# Altium footprint library Nanjar's Arduino Library.PcbLib: 16 footprints
Each footprint in its own frame and in the unit in brackets; x right, y up, seen from the top. Pads: shape width x height; smd on the part's side, far side on the other; paste and mask are expansions set on the pad; w line width, h text height; cw(c..) or ccw(c..) is an arc to the next point about the centre after c.
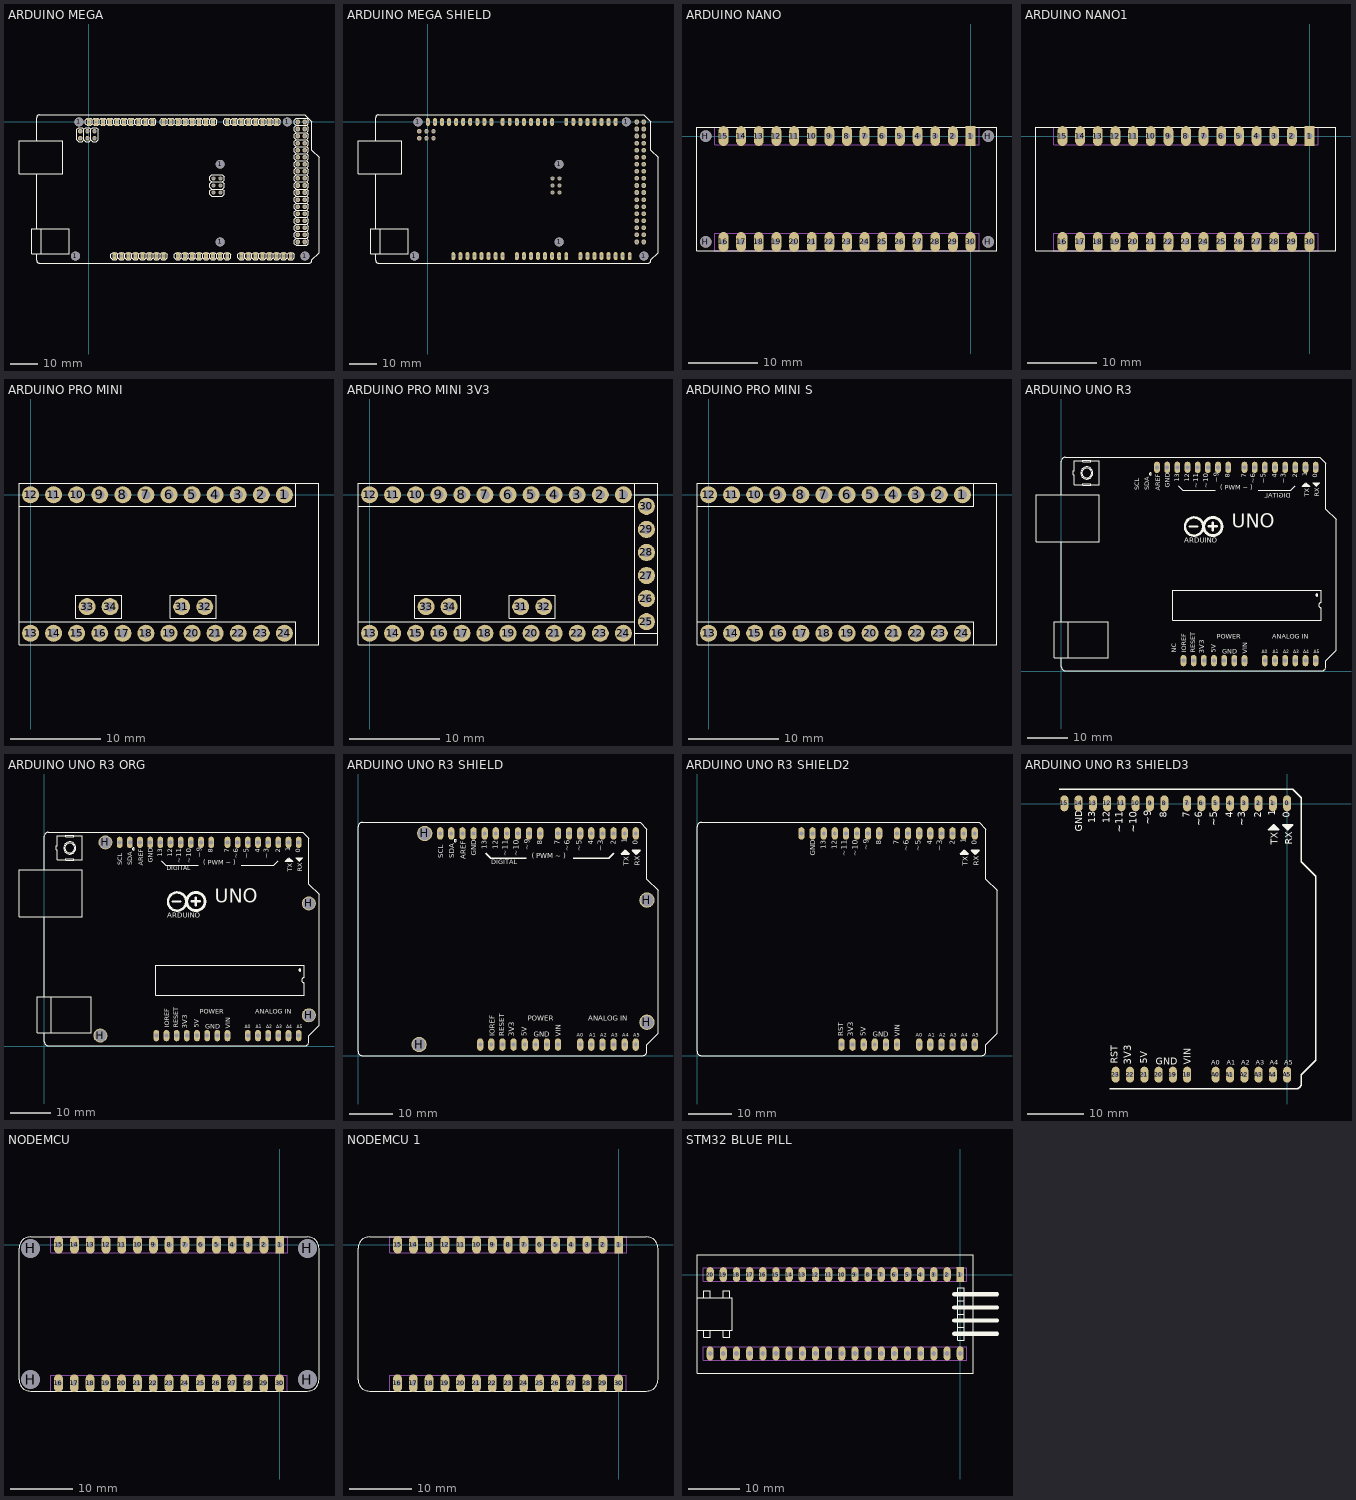
[diagram p0: the footprints below, top view; thin cyan lines are the x and y axes]

## ARDUINO MEGA [mil]
pads (104):
  round 125.98 hole 125.98: 1(-190,-1900) 1(-140,0) 1(1860,-1700) 1(1860,-600) 1(2810,0) 1(3060,-1900)
  oval 56x112 hole 33.46: 1(0,0) 1(360,-1900) 1(1260,-1900) 1(1760,0) 1(2160,-1900) 1(2660,0) 2(100,0) 2(460,-1900) 2(1360,-1900) 2(1660,0) 2(2260,-1900) 2(2560,0) 3(200,0) 3(560,-1900) 3(1460,-1900) 3(1560,0) 3(2360,-1900) 3(2460,0) 4(300,0) 4(660,-1900) 4(1460,0) 4(1560,-1900) 4(2360,0) 4(2460,-1900) 5(400,0) 5(760,-1900) 5(1360,0) 5(1660,-1900) 5(2260,0) 5(2560,-1900) 6(500,0) 6(860,-1900) 6(1260,0) 6(1760,-1900) 6(2160,0) 6(2660,-1900) 7(600,0) 7(960,-1900) 7(1160,0) 7(1860,-1900) 7(2060,0) 7(2760,-1900) 8(700,0) 8(1060,-1900) 8(1060,0) 8(1960,-1900) 8(1960,0) 8(2860,-1900) 9(800,0) 10(900,0)
  oct 61.02x61.02 hole 37.4: 1(80,-130) 1(1765,-800) 2(80,-230) 2(1865,-800) 3(-20,-130) 3(1765,-900) 4(-20,-230) 4(1865,-900) 5(-120,-130) 5(1765,-1000) 6(-120,-230) 6(1865,-1000)
  oct 66x66 hole 37.4: 1(2960,0) 2(3060,0) 3(2960,-100) 4(3060,-100) 5(2960,-200) 6(3060,-200) 7(2960,-300) 8(3060,-300) 9(2960,-400) 10(3060,-400) 11(2960,-500) 12(3060,-500) 13(2960,-600) 14(3060,-600) 15(2960,-700) 16(3060,-700) 17(2960,-800) 18(3060,-800) 19(2960,-900) 20(3060,-900) 21(2960,-1000) 22(3060,-1000) 23(2960,-1100) 24(3060,-1100) 25(2960,-1200) 26(3060,-1200) 27(2960,-1300) 28(3060,-1300) 29(2960,-1400) 30(3060,-1400) 31(2960,-1500) 32(3060,-1500) 33(2960,-1600) 34(3060,-1600) 35(2960,-1700) 36(3060,-1700)
Top Overlay:
  drawing of 553 lines, arcs and shapes, not listed

## ARDUINO MEGA 3D on Bottom [mil]
3D body "User Library-ARDUINO_MEGA_2560.STEP": height -76.77, standoff -677.17, extent -4250,0 0,2100

## ARDUINO MEGA SHIELD [mil]
pads (104):
  round 125.98 hole 125.98: 1(-190,-1900) 1(-140,0) 1(1860,-1700) 1(1860,-600) 1(2810,0) 1(3060,-1900)
  oval 56x112 hole 33.46: 1(0,0) 1(360,-1900) 1(1260,-1900) 1(1760,0) 1(2160,-1900) 1(2660,0) 2(100,0) 2(460,-1900) 2(1360,-1900) 2(1660,0) 2(2260,-1900) 2(2560,0) 3(200,0) 3(560,-1900) 3(1460,-1900) 3(1560,0) 3(2360,-1900) 3(2460,0) 4(300,0) 4(660,-1900) 4(1460,0) 4(1560,-1900) 4(2360,0) 4(2460,-1900) 5(400,0) 5(760,-1900) 5(1360,0) 5(1660,-1900) 5(2260,0) 5(2560,-1900) 6(500,0) 6(860,-1900) 6(1260,0) 6(1760,-1900) 6(2160,0) 6(2660,-1900) 7(600,0) 7(960,-1900) 7(1160,0) 7(1860,-1900) 7(2060,0) 7(2760,-1900) 8(700,0) 8(1060,-1900) 8(1060,0) 8(1960,-1900) 8(1960,0) 8(2860,-1900) 9(800,0) 10(900,0)
  oct 61.02x61.02 hole 37.4: 1(80,-130) 1(1765,-800) 2(80,-230) 2(1865,-800) 3(-20,-130) 3(1765,-900) 4(-20,-230) 4(1865,-900) 5(-120,-130) 5(1765,-1000) 6(-120,-230) 6(1865,-1000)
  oct 66x66 hole 37.4: 1(2960,0) 2(3060,0) 3(2960,-100) 4(3060,-100) 5(2960,-200) 6(3060,-200) 7(2960,-300) 8(3060,-300) 9(2960,-400) 10(3060,-400) 11(2960,-500) 12(3060,-500) 13(2960,-600) 14(3060,-600) 15(2960,-700) 16(3060,-700) 17(2960,-800) 18(3060,-800) 19(2960,-900) 20(3060,-900) 21(2960,-1000) 22(3060,-1000) 23(2960,-1100) 24(3060,-1100) 25(2960,-1200) 26(3060,-1200) 27(2960,-1300) 28(3060,-1300) 29(2960,-1400) 30(3060,-1400) 31(2960,-1500) 32(3060,-1500) 33(2960,-1600) 34(3060,-1600) 35(2960,-1700) 36(3060,-1700)
Top Overlay:
  lines w5: -674,-1869 -674,-1516 ; -674,-1516 -811,-1516 -811,-1870 -292.5,-1870 -280,-1870 -280,-1570 -280,-1516 -674,-1516
  lines w10: -740,-1873 -740,-1960.63 ccw(c-700.63,-1960.63) -700.63,-2000 3120.63,-2000 ccw(c3120.63,-1960.63) 3160,-1960.63 3160,-1950 3260,-1850 3260,-500 3160,-400 3160,0 3060,100 -700.63,100 ccw(c-700.63,60.63) -740,60.63 -740,-267.72 ; -740,-1513 -740,-732.28 ; -989.61,-732.28 -369.53,-732.28 -369.53,-267.72 -989.61,-267.72 -989.61,-732.28

## ARDUINO NANO [mil]
pads (34):
  rect 56x112 hole 36: 1(0,0)
  oval 56x112 hole 36: 2(-100,0) 3(-200,0) 4(-300,0) 5(-400,0) 6(-500,0) 7(-600,0) 8(-700,0) 9(-800,0) 10(-900,0) 11(-1000,0) 12(-1100,0) 13(-1200,0) 14(-1300,0) 15(-1400,0) 16(-1400,-600) 17(-1300,-600) 18(-1200,-600) 19(-1100,-600) 20(-1000,-600) 21(-900,-600) 22(-800,-600) 23(-700,-600) 24(-600,-600) 25(-500,-600) 26(-400,-600) 27(-300,-600) 28(-200,-600) 29(-100,-600) 30(0,-600)
  round 65 hole 65: H(-1500,-600) H(-1500,0) H(100,-600) H(100,0)
Top Overlay:
  lines w7: -1550,-650 150,-650 150,50 -1550,50 -1550,-650
Mechanical 8:
  lines w5: -1450,-650 -1450,-550 50,-550 50,-650 -1450,-650 ; -1450,-50 -1450,50 50,50 50,-50 -1450,-50
3D body "arduino_nano.stp": height 651.57, standoff 106.3, extent -1621.26,-654.33 150.39,54.33
3D body "Header Female 2p.step": height 334.65, standoff -82.42, extent -950,-650 -750,-550
3D body "Header Female 2p.step": height 334.65, standoff -82.42, extent -1150,-650 -950,-550
3D body "Header Female 2p.step": height 334.65, standoff -82.42, extent -150,-650 50,-550
3D body "Header Female 2p.step": height 334.65, standoff -82.42, extent -350,-650 -150,-550
3D body "Header Female 2p.step": height 334.65, standoff -82.42, extent -550,-650 -350,-550
3D body "Header Female 2p.step": height 334.65, standoff -82.42, extent -750,-650 -550,-550
3D body "Header Female 2p.step": height 334.65, standoff -82.42, extent -950,-50 -750,50
3D body "Header Female 2p.step": height 334.65, standoff -82.42, extent -1150,-50 -950,50
3D body "Header Female 2p.step": height 334.65, standoff -82.42, extent -150,-50 50,50
3D body "Header Female 2p.step": height 334.65, standoff -82.42, extent -350,-50 -150,50
3D body "Header Female 2p.step": height 334.65, standoff -82.42, extent -550,-50 -350,50
3D body "Header Female 2p.step": height 334.65, standoff -82.42, extent -750,-50 -550,50
3D body "Header Female 2p.step": height 334.65, standoff -82.42, extent -1350,-50 -1150,50
3D body "Header Female 1p.step": height 334.65, standoff -82.42, extent -1450,-50 -1350,50
3D body "Header Female 2p.step": height 334.65, standoff -82.42, extent -1350,-650 -1150,-550
3D body "Header Female 1p.step": height 334.65, standoff -82.42, extent -1450,-650 -1350,-550

## ARDUINO NANO1 [mil]
pads (30):
  rect 56x112 hole 36: 1(0,0)
  oval 56x112 hole 36: 2(-100,0) 3(-200,0) 4(-300,0) 5(-400,0) 6(-500,0) 7(-600,0) 8(-700,0) 9(-800,0) 10(-900,0) 11(-1000,0) 12(-1100,0) 13(-1200,0) 14(-1300,0) 15(-1400,0) 16(-1400,-600) 17(-1300,-600) 18(-1200,-600) 19(-1100,-600) 20(-1000,-600) 21(-900,-600) 22(-800,-600) 23(-700,-600) 24(-600,-600) 25(-500,-600) 26(-400,-600) 27(-300,-600) 28(-200,-600) 29(-100,-600) 30(0,-600)
Top Overlay:
  lines w7: -1550,-650 -1550,50 150,50 150,-650 -1550,-650
Mechanical 8:
  lines w5: -1450,-650 50,-650 50,-550 -1450,-550 -1450,-650 ; -1450,-50 50,-50 50,50 -1450,50 -1450,-50
3D body "Header Female 1p.step": height 334.65, standoff -82.42, extent -1450,-650 -1350,-550
3D body "Header Female 2p.step": height 334.65, standoff -82.42, extent -1350,-650 -1150,-550
3D body "Header Female 1p.step": height 334.65, standoff -82.42, extent -1450,-50 -1350,50
3D body "Header Female 2p.step": height 334.65, standoff -82.42, extent -1350,-50 -1150,50
3D body "Header Female 2p.step": height 334.65, standoff -82.42, extent -750,-50 -550,50
3D body "Header Female 2p.step": height 334.65, standoff -82.42, extent -550,-50 -350,50
3D body "Header Female 2p.step": height 334.65, standoff -82.42, extent -350,-50 -150,50
3D body "Header Female 2p.step": height 334.65, standoff -82.42, extent -150,-50 50,50
3D body "Header Female 2p.step": height 334.65, standoff -82.42, extent -1150,-50 -950,50
3D body "Header Female 2p.step": height 334.65, standoff -82.42, extent -950,-50 -750,50
3D body "Header Female 2p.step": height 334.65, standoff -82.42, extent -750,-650 -550,-550
3D body "Header Female 2p.step": height 334.65, standoff -82.42, extent -550,-650 -350,-550
3D body "Header Female 2p.step": height 334.65, standoff -82.42, extent -350,-650 -150,-550
3D body "Header Female 2p.step": height 334.65, standoff -82.42, extent -150,-650 50,-550
3D body "Header Female 2p.step": height 334.65, standoff -82.42, extent -1150,-650 -950,-550
3D body "Header Female 2p.step": height 334.65, standoff -82.42, extent -950,-650 -750,-550
3D body "arduino_nano.stp": height 651.57, standoff 106.3, extent -1621.26,-654.33 150.39,54.33

## ARDUINO PRO MINI [mil]
pads (28):
  round 74 hole 40: 1(1100,0) 2(1000,0) 3(900,0) 4(800,0) 5(700,0) 6(600,0) 7(500,0) 8(400,0) 9(300,0) 10(200,0) 11(100,0) 12(0,0) 13(0,-600) 14(100,-600) 15(200,-600) 16(300,-600) 17(400,-600) 18(500,-600) 19(600,-600) 20(700,-600) 21(800,-600) 22(900,-600) 23(1000,-600) 24(1100,-600) 31(655,-485) 32(755,-485) 33(245,-485) 34(345,-485)
Top Overlay:
  lines w5: -50,-649.61 -50,50 ; 550,50 1250,50 1250,-650 -50,-650 ; -50,-650 -50,-550 1150,-550 1150,-650 -50,-650 ; -50,50 1150,50 1150,-50 -50,-50 -50,50 ; 195,-535 195,-435 395,-435 395,-535 195,-535 ; 605,-535 805,-535 805,-435 605,-435 605,-535
3D body "Header Female 2p.step": height 334.65, standoff -82.42, extent 195,-535 395,-435
3D body "Header Female 2p.step": height 334.65, standoff -82.42, extent 605,-535 805,-435
3D body "Header Female 2p.step": height 334.65, standoff -82.42, extent -50,-50 150,50
3D body "Header Female 2p.step": height 334.65, standoff -82.42, extent -50,-650 150,-550
3D body "Header Female 2p.step": height 334.65, standoff -82.42, extent 150,-650 350,-550
3D body "Header Female 2p.step": height 334.65, standoff -82.42, extent 350,-650 550,-550
3D body "Header Female 2p.step": height 334.65, standoff -82.42, extent 550,-650 750,-550
3D body "Header Female 2p.step": height 334.65, standoff -82.42, extent 750,-650 950,-550
3D body "Header Female 2p.step": height 334.65, standoff -82.42, extent 950,-650 1150,-550
3D body "Header Female 2p.step": height 334.65, standoff -82.42, extent 150,-50 350,50
3D body "Header Female 2p.step": height 334.65, standoff -82.42, extent 350,-50 550,50
3D body "Header Female 2p.step": height 334.65, standoff -82.42, extent 550,-50 750,50
3D body "Header Female 2p.step": height 334.65, standoff -82.42, extent 750,-50 950,50
3D body "Header Female 2p.step": height 334.65, standoff -82.42, extent 950,-50 1150,50
3D body "Pro Mini.stp": height 571.07, standoff 69.29, extent -50,-650 1250,50

## ARDUINO PRO MINI 3V3 [mil]
pads (34):
  round 74 hole 40: 1(1100,0) 2(1000,0) 3(900,0) 4(800,0) 5(700,0) 6(600,0) 7(500,0) 8(400,0) 9(300,0) 10(200,0) 11(100,0) 12(0,0) 13(0,-600) 14(100,-600) 15(200,-600) 16(300,-600) 17(400,-600) 18(500,-600) 19(600,-600) 20(700,-600) 21(800,-600) 22(900,-600) 23(1000,-600) 24(1100,-600) 25(1200,-550) 26(1200,-450) 27(1200,-350) 28(1200,-250) 29(1200,-150) 30(1200,-50) 31(655,-485) 32(755,-485) 33(245,-485) 34(345,-485)
Top Overlay:
  lines w5: -50,-649.61 -50,50 ; 550,50 1250,50 1250,-650 -50,-650 ; 1150,0 1250,0 ; 1250,-600 1150,-600 1150,-330.12 ; -50,-650 -50,-550 1150,-550 1150,-650 -50,-650 ; -50,50 1150,50 1150,-50 ; -50,50 -50,-50 1150,-50 ; 1150,-330.12 1150,-330.12 ; 1150,-330.12 1150,-50 ; 195,-535 195,-435 395,-435 395,-535 195,-535 ; 605,-535 805,-535 805,-435 605,-435 605,-535
3D body "ASSEMBLY_AP214.STEP": height 571.07, standoff 69.29, extent -50,-650 1250,50
3D body "Header Female 2p.step": height 334.65, standoff -82.42, extent 950,-50 1150,50
3D body "Header Female 2p.step": height 334.65, standoff -82.42, extent 750,-50 950,50
3D body "Header Female 2p.step": height 334.65, standoff -82.42, extent 550,-50 750,50
3D body "Header Female 2p.step": height 334.65, standoff -82.42, extent 350,-50 550,50
3D body "Header Female 2p.step": height 334.65, standoff -82.42, extent 150,-50 350,50
3D body "Header Female 2p.step": height 334.65, standoff -82.42, extent 1150,-200 1250,0
3D body "Header Female 2p.step": height 334.65, standoff -82.42, extent 1150,-400 1250,-200
3D body "Header Female 2p.step": height 334.65, standoff -82.42, extent 1150,-600 1250,-400
3D body "Header Female 2p.step": height 334.65, standoff -82.42, extent 950,-650 1150,-550
3D body "Header Female 2p.step": height 334.65, standoff -82.42, extent 750,-650 950,-550
3D body "Header Female 2p.step": height 334.65, standoff -82.42, extent 550,-650 750,-550
3D body "Header Female 2p.step": height 334.65, standoff -82.42, extent 350,-650 550,-550
3D body "Header Female 2p.step": height 334.65, standoff -82.42, extent 150,-650 350,-550
3D body "Header Female 2p.step": height 334.65, standoff -82.42, extent -50,-650 150,-550
3D body "Header Female 2p.step": height 334.65, standoff -82.42, extent -50,-50 150,50
3D body "Header Female 2p.step": height 334.65, standoff -82.42, extent 605,-535 805,-435
3D body "Header Female 2p.step": height 334.65, standoff -82.42, extent 195,-535 395,-435

## ARDUINO PRO MINI S [mil]
pads (24):
  round 74 hole 40: 1(1100,0) 2(1000,0) 3(900,0) 4(800,0) 5(700,0) 6(600,0) 7(500,0) 8(400,0) 9(300,0) 10(200,0) 11(100,0) 12(0,0) 13(0,-600) 14(100,-600) 15(200,-600) 16(300,-600) 17(400,-600) 18(500,-600) 19(600,-600) 20(700,-600) 21(800,-600) 22(900,-600) 23(1000,-600) 24(1100,-600)
Top Overlay:
  lines w5: -50,-649.61 -50,50 ; 550,50 1250,50 1250,-650 -50,-650 ; -50,-650 -50,-550 1150,-550 1150,-650 -50,-650 ; -50,50 1150,50 1150,-50 -50,-50 -50,50
3D body "Pro Mini.stp": height 571.07, standoff 69.29, extent -50,-650 1250,50
3D body "Header Female 2p.step": height 334.65, standoff -82.42, extent 950,-50 1150,50
3D body "Header Female 2p.step": height 334.65, standoff -82.42, extent 750,-50 950,50
3D body "Header Female 2p.step": height 334.65, standoff -82.42, extent 550,-50 750,50
3D body "Header Female 2p.step": height 334.65, standoff -82.42, extent 350,-50 550,50
3D body "Header Female 2p.step": height 334.65, standoff -82.42, extent 150,-50 350,50
3D body "Header Female 2p.step": height 334.65, standoff -82.42, extent 950,-650 1150,-550
3D body "Header Female 2p.step": height 334.65, standoff -82.42, extent 750,-650 950,-550
3D body "Header Female 2p.step": height 334.65, standoff -82.42, extent 550,-650 750,-550
3D body "Header Female 2p.step": height 334.65, standoff -82.42, extent 350,-650 550,-550
3D body "Header Female 2p.step": height 334.65, standoff -82.42, extent 150,-650 350,-550
3D body "Header Female 2p.step": height 334.65, standoff -82.42, extent -50,-650 150,-550
3D body "Header Female 2p.step": height 334.65, standoff -82.42, extent -50,-50 150,50

## ARDUINO UNO R3 [mil]
pads (29):
  oval 56x112 hole 39.37: 0(2500,2002.95) 1(2400,2002.95) 2(2300,2002.95) 3(2200,2002.95) 4(2100,2002.95) 5(2000,2002.95) 6(1900,2002.95) 7(1800,2002.95) 8(1640,2002.95) 9(1540,2002.95) 10(1440,2002.95) 11(1340,2002.95) 12(1240,2002.95) 13(1140,2002.95) 14(1040,2002.95) 15(940,2002.95) 18(1800,102.95) 19(1700,102.95) 20(1600,102.95) 21(1500,102.95) 22(1400,102.95) 23(1300,102.95) 24(1200,102.95) A0(2000,102.95) A1(2100,102.95) A2(2200,102.95) A3(2300,102.95) A4(2400,102.95) A5(2500,102.95)
Top Overlay:
  circle w10: c2512.64,748.03 r10
  circle w10: c875,1937.95 r10
  circle w23.62: c1304.27,1421.26 r89.43
  circle w27.56: c1489.38,1421.26 r89.36
  circle w5: c250,1947.95 r60
  circle w5: c250,1947.95 r48
  lines w5: 210.63,1829.72 210.63,1825.79 290,1825.79 290,1829.72 ; 210.63,2066.93 127.95,2066.93 127.95,1967.95 118.11,1967.95 118.11,1928.27 127.95,1928.27 127.95,1830.71 210.63,1830.71 210.63,1842.52 290,1842.52 290,1830.71 374.02,1830.71 374.02,2066.93 290,2066.93 ; 210.63,2056.1 289.37,2056.1 289.37,2071.85 210.63,2071.85 210.63,2056.1
  lines w10: 0,42.95 ccw(c40,42.95) 40,2.95 2561,2.95 ccw(c2560.5,42.45) 2600,42.95 2600,102.95 2700,202.95 2700,1492.95 2600,1592.95 2600,2042.95 2540,2102.95 40,2102.95 ccw(c39.5,2063.45) 0,2063.95 ; 0,43.31 0,132.87 ; 0,487.2 0,1269.68 ; 0,1735.24 0,2063.98 ; 66,133.95 66,486.95 ; 459.65,132.95 -71,132.95 -71,486.95 66,486.95 ; 66,486.95 460,486.95 ; 460,486.95 460,133.86 460,486.95 ; -249.61,1269.95 -249.61,1735.24 371,1735.24 371,1269.95 -249.61,1269.95 ; 1095.04,498.03 2555.04,498.03 2555.04,622.72 cw(c2555.04,647.72) 2555.04,672.72 2555.04,797.24 1095.04,797.24 1095.04,498.03
  lines w12: 1150,1822.95 1195,1777.95 1515,1777.95 ; 1935,1777.95 2255,1777.95 2300,1822.95 ; 2400,1827.95 2420,1827.95 2405,1842.95 2385,1822.95 2425,1822.95 ; 2405,1832.95 2405,1837.95 ; 2485,1847.95 2525,1847.95 2505,1827.95 2490,1842.95 2510,1842.95 ; 2505,1832.95 2505,1837.95 ; 2370,1817.95 2440,1817.95 2405,1852.95 2370,1817.95 ; 2470,1852.95 2540,1852.95 2505,1817.95 2470,1852.95
  lines w23.62: 1259.84,1421.26 1338.58,1421.26 ; 1448.82,1425.2 1527.56,1425.2 ; 1488.19,1381.89 1488.19,1460.63
  text "NC" at 1131.57,177.95 h47.6
  text "AREF" at 970,1772.95 h47.6
  text "GND" at 1065,1802.95 h47.6
  text "0" at 2517.58,1901.23 h47.6
  text "1" at 2417.58,1917.09 h47.6
  text "2" at 2317.58,1901.23 h47.6
  text "~3" at 2225,1842.95 h86.61
  text "4" at 2117.58,1901.23 h47.6
  text "~5" at 2030,1842.95 h86.61
  text "~6" at 1925,1842.95 h86.61
  text "7" at 1817.58,1901.23 h47.6
  text "8" at 1657.58,1901.23 h47.6
  text "~9" at 1565,1852.95 h86.61
  text "~10" at 1465,1797.95 h86.61
  text "~11" at 1365,1797.95 h86.61
  text "12" at 1257.58,1861.58 h47.6
  text "13" at 1157.58,1861.58 h47.6
  text "A0" at 1969,173.95 h34
  text "A5" at 2479,173.95 h34
  text "5V" at 1520,177.95 h47.6
  text "A1" at 2079,173.95 h34
  text "A3" at 2279,173.95 h34
  text "SCL" at 765,1777.95 h47.6
  text "A4" at 2379,173.95 h34
  text "3V3" at 1425,172.95 h86.61
  text "IOREF" at 1230,177.95 h47.6
  text "SDA" at 865,1777.95 h47.6
  text "TX" at 2435,1713.95 h47.6
  text "GND" at 1581,172.95 h47.6
  text "A2" at 2179,173.95 h34
  text "RX" at 2535,1712.95 h47.6
  text "VIN" at 1825,172.95 h47.6
  text "( PWM ~ )" at 1563.98,1762.8 h78.74
  text "RESET" at 1315,177.95 h47.6
  text "ARDUINO" at 1208.66,1244.09 h86.61
  text "UNO" at 1677.17,1358.27 h236.22
  text "ANALOG IN" at 2070.87,298.23 h78.74
  text "DIGITAL" at 2254.92,1684.06 h78.74
  text "POWER" at 1526.57,298.23 h78.74

## ARDUINO UNO R3 ORG [mm]
pads (36):
  oval 1.422x2.845 hole 1: 0(63.5,50.875) 1(60.96,50.875) 2(58.42,50.875) 3(55.88,50.875) 4(53.34,50.875) 5(50.8,50.875) 6(48.26,50.875) 7(45.72,50.875) 8(41.656,50.875) 9(39.116,50.875) 10(36.576,50.875) 11(34.036,50.875) 12(31.496,50.875) 13(28.956,50.875) 14(26.416,50.875) 15(23.876,50.875) 16(21.336,50.875) 17(18.796,50.875) 18(45.72,2.615) 19(43.18,2.615) 20(40.64,2.615) 21(38.1,2.615) 22(35.56,2.615) 23(33.02,2.615) 24(30.48,2.615) 25(27.94,2.615) A0(50.8,2.615) A1(53.34,2.615) A2(55.88,2.615) A3(58.42,2.615) A4(60.96,2.615) A5(63.5,2.615)
  round 3.5 hole 3: H(13.97,2.615) H(15.24,50.875) H(66.04,7.695) H(66.04,35.635)
Top Overlay:
  circle w0.254: c63.821,19 r0.254
  circle w0.254: c22.225,49.224 r0.254
  circle w0.6: c33.128,36.1 r2.272
  circle w0.7: c37.83,36.1 r2.27
  circle w0.127: c6.35,49.478 r1.524
  circle w0.127: c6.35,49.478 r1.219
  lines w0.127: 5.35,46.475 5.35,46.375 7.366,46.375 7.366,46.475 ; 5.35,52.5 3.25,52.5 3.25,49.986 3,49.986 3,48.978 3.25,48.978 3.25,46.5 5.35,46.5 5.35,46.8 7.366,46.8 7.366,46.5 9.5,46.5 9.5,52.5 7.366,52.5 ; 5.35,52.225 7.35,52.225 7.35,52.625 5.35,52.625 5.35,52.225
  lines w0.254: 0,1.091 ccw(c1.016,1.091) 1.016,0.075 65.049,0.075 ccw(c65.037,1.078) 66.04,1.091 66.04,2.615 68.58,5.155 68.58,37.921 66.04,40.461 66.04,51.891 64.516,53.415 1.016,53.415 ccw(c1.003,52.412) 0,52.424 ; 0,1.1 0,3.375 ; 0,12.375 0,32.25 ; 0,44.075 0,52.425 ; 1.676,3.402 1.676,12.369 ; 11.675,3.377 -1.803,3.377 -1.803,12.369 1.676,12.369 ; 1.676,12.369 11.684,12.369 ; 11.684,12.369 11.684,3.4 11.684,12.369 ; -6.34,32.257 -6.34,44.075 9.423,44.075 9.423,32.257 -6.34,32.257 ; 27.814,12.65 64.898,12.65 64.898,15.817 cw(c64.898,16.452) 64.898,17.087 64.898,20.25 27.814,20.25 27.814,12.65
  lines w0.305: 29.21,46.303 30.353,45.16 38.481,45.16 ; 49.149,45.16 57.277,45.16 58.42,46.303 ; 60.96,46.43 61.468,46.43 61.087,46.811 60.579,46.303 61.595,46.303 ; 61.087,46.557 61.087,46.684 ; 63.119,46.938 64.135,46.938 63.627,46.43 63.246,46.811 63.754,46.811 ; 63.627,46.557 63.627,46.684 ; 60.198,46.176 61.976,46.176 61.087,47.065 60.198,46.176 ; 62.738,47.065 64.516,47.065 63.627,46.176 62.738,47.065
  lines w0.6: 32,36.1 34,36.1 ; 36.8,36.2 38.8,36.2 ; 37.8,35.1 37.8,37.1
  text "AREF" at 24.638,45.033 h1.21
  text "GND" at 27.051,45.795 h1.21
  text "0" at 63.947,48.291 h1.21
  text "1" at 61.407,48.694 h1.21
  text "2" at 58.867,48.291 h1.21
  text "~3" at 56.515,46.811 h2.2
  text "4" at 53.787,48.291 h1.21
  text "~5" at 51.562,46.811 h2.2
  text "~6" at 48.895,46.811 h2.2
  text "7" at 46.167,48.291 h1.21
  text "8" at 42.103,48.291 h1.21
  text "~9" at 39.751,47.065 h2.2
  text "~10" at 37.211,45.668 h2.2
  text "~11" at 34.671,45.668 h2.2
  text "12" at 31.943,47.284 h1.21
  text "13" at 29.403,47.284 h1.21
  text "A0" at 50.013,4.418 h0.86
  text "A5" at 62.967,4.418 h0.86
  text "5V" at 38.608,4.52 h1.21
  text "A1" at 52.807,4.418 h0.86
  text "A3" at 57.887,4.418 h0.86
  text "SCL" at 19.431,45.16 h1.21
  text "A4" at 60.427,4.418 h0.86
  text "3V3" at 36.195,4.393 h2.2
  text "IOREF" at 31.242,4.52 h1.21
  text "SDA" at 21.971,45.16 h1.21
  text "TX" at 61.849,43.534 h1.21
  text "GND" at 40.157,4.393 h1.21
  text "A2" at 55.347,4.418 h0.86
  text "RX" at 64.389,43.509 h1.21
  text "VIN" at 46.355,4.393 h1.21
  text "( PWM ~ )" at 39.725,44.775 h2
  text "RESET" at 33.401,4.52 h1.21
  text "ARDUINO" at 30.7,31.6 h2.2
  text "UNO" at 42.6,34.5 h6
  text "ANALOG IN" at 52.6,7.575 h2
  text "DIGITAL" at 30.5,43.5 h1.8
  text "POWER" at 38.775,7.575 h2

## ARDUINO UNO R3 SHIELD [mil]
pads (36):
  oval 56x112 hole 34: 0(2500,2002.95) 1(2400,2002.95) 2(2300,2002.95) 3(2200,2002.95) 4(2100,2002.95) 5(2000,2002.95) 6(1900,2002.95) 7(1800,2002.95) 8(1640,2002.95) 9(1540,2002.95) 10(1440,2002.95) 11(1340,2002.95) 12(1240,2002.95) 13(1140,2002.95) 14(1040,2002.95) 15(940,2002.95) 16(840,2002.95) 17(740,2002.95) 18(1800,102.95) 19(1700,102.95) 20(1600,102.95) 21(1500,102.95) 22(1400,102.95) 23(1300,102.95) 24(1200,102.95) 25(1100,102.95) A0(2000,102.95) A1(2100,102.95) A2(2200,102.95) A3(2300,102.95) A4(2400,102.95) A5(2500,102.95)
  round 137.8 hole 118.11: H(550,102.95) H(600,2002.95) H(2600,302.95) H(2600,1402.95)
Top Overlay:
  circle w10: c875,1937.95 r10
  lines w10: 0,42.95 ccw(c40,42.95) 40,2.95 2561,2.95 ccw(c2560.5,42.45) 2600,42.95 2600,102.95 2700,202.95 2700,1492.95 2600,1592.95 2600,2042.95 2540,2102.95 40,2102.95 ccw(c39.5,2063.45) 0,2063.95 ; 0,43.31 0,132.87 ; 0,131.5 0,1735.24 0,2063.98
  lines w12: 1150,1822.95 1195,1777.95 1515,1777.95 ; 1935,1777.95 2255,1777.95 2300,1822.95 ; 2400,1827.95 2420,1827.95 2405,1842.95 2385,1822.95 2425,1822.95 ; 2405,1832.95 2405,1837.95 ; 2485,1847.95 2525,1847.95 2505,1827.95 2490,1842.95 2510,1842.95 ; 2505,1832.95 2505,1837.95 ; 2370,1817.95 2440,1817.95 2405,1852.95 2370,1817.95 ; 2470,1852.95 2540,1852.95 2505,1817.95 2470,1852.95
  text "AREF" at 970,1772.95 h47.6
  text "GND" at 1065,1802.95 h47.6
  text "0" at 2517.58,1901.23 h47.6
  text "1" at 2417.58,1917.09 h47.6
  text "2" at 2317.58,1901.23 h47.6
  text "~3" at 2225,1842.95 h86.61
  text "4" at 2117.58,1901.23 h47.6
  text "~5" at 2030,1842.95 h86.61
  text "~6" at 1925,1842.95 h86.61
  text "7" at 1817.58,1901.23 h47.6
  text "8" at 1657.58,1901.23 h47.6
  text "~9" at 1565,1852.95 h86.61
  text "~10" at 1465,1797.95 h86.61
  text "~11" at 1365,1797.95 h86.61
  text "12" at 1257.58,1861.58 h47.6
  text "13" at 1157.58,1861.58 h47.6
  text "A0" at 1969,173.95 h34
  text "A5" at 2479,173.95 h34
  text "5V" at 1520,177.95 h47.6
  text "A1" at 2079,173.95 h34
  text "A3" at 2279,173.95 h34
  text "SCL" at 765,1777.95 h47.6
  text "A4" at 2379,173.95 h34
  text "3V3" at 1425,172.95 h86.61
  text "IOREF" at 1230,177.95 h47.6
  text "SDA" at 865,1777.95 h47.6
  text "TX" at 2435,1713.95 h47.6
  text "GND" at 1581,172.95 h47.6
  text "A2" at 2179,173.95 h34
  text "RX" at 2535,1712.95 h47.6
  text "VIN" at 1825,172.95 h47.6
  text "( PWM ~ )" at 1563.98,1762.8 h78.74
  text "RESET" at 1315,177.95 h47.6
  text "ANALOG IN" at 2070.87,298.23 h78.74
  text "DIGITAL" at 1200.79,1712.6 h70.87
  text "POWER" at 1526.57,298.23 h78.74

## ARDUINO UNO R3 SHIELD2 [mil]
pads (28):
  oval 56x112 hole 34: 0(2500,2002.95) 1(2400,2002.95) 2(2300,2002.95) 3(2200,2002.95) 4(2100,2002.95) 5(2000,2002.95) 6(1900,2002.95) 7(1800,2002.95) 8(1640,2002.95) 9(1540,2002.95) 10(1440,2002.95) 11(1340,2002.95) 12(1240,2002.95) 13(1140,2002.95) 14(1040,2002.95) 15(940,2002.95) 18(1800,102.95) 19(1700,102.95) 20(1600,102.95) 21(1500,102.95) 22(1400,102.95) 23(1300,102.95) A0(2000,102.95) A1(2100,102.95) A2(2200,102.95) A3(2300,102.95) A4(2400,102.95) A5(2500,102.95)
Top Overlay:
  lines w10: 0,42.95 ccw(c40,42.95) 40,2.95 2561,2.95 ccw(c2560.5,42.45) 2600,42.95 2600,102.95 2700,202.95 2700,1492.95 2600,1592.95 2600,2042.95 2540,2102.95 40,2102.95 ccw(c39.5,2063.45) 0,2063.95 ; 0,43.31 0,132.87 ; 0,131.5 0,1735.24 0,2063.98
  lines w12: 2400,1827.95 2420,1827.95 2405,1842.95 2385,1822.95 2425,1822.95 ; 2405,1832.95 2405,1837.95 ; 2485,1847.95 2525,1847.95 2505,1827.95 2490,1842.95 2510,1842.95 ; 2505,1832.95 2505,1837.95 ; 2370,1817.95 2440,1817.95 2405,1852.95 2370,1817.95 ; 2470,1852.95 2540,1852.95 2505,1817.95 2470,1852.95
  text "GND" at 1065,1802.95 h47.6
  text "0" at 2517.58,1901.23 h47.6
  text "1" at 2417.58,1917.09 h47.6
  text "2" at 2317.58,1901.23 h47.6
  text "~3" at 2225,1842.95 h86.61
  text "4" at 2117.58,1901.23 h47.6
  text "~5" at 2030,1842.95 h86.61
  text "~6" at 1925,1842.95 h86.61
  text "7" at 1817.58,1901.23 h47.6
  text "8" at 1657.58,1901.23 h47.6
  text "~9" at 1565,1852.95 h86.61
  text "~10" at 1465,1797.95 h86.61
  text "~11" at 1365,1797.95 h86.61
  text "12" at 1257.58,1861.58 h47.6
  text "13" at 1157.58,1861.58 h47.6
  text "A0" at 1969,173.95 h34
  text "A5" at 2479,173.95 h34
  text "5V" at 1520,177.95 h47.6
  text "A1" at 2079,173.95 h34
  text "A3" at 2279,173.95 h34
  text "A4" at 2379,173.95 h34
  text "3V3" at 1425,172.95 h86.61
  text "TX" at 2435,1713.95 h47.6
  text "GND" at 1581,172.95 h47.6
  text "A2" at 2179,173.95 h34
  text "RX" at 2535,1712.95 h47.6
  text "VIN" at 1825,172.95 h47.6
  text "RST" at 1315,177.95 h47.6

## ARDUINO UNO R3 SHIELD3 [mil]
pads (28):
  oval 56x112 hole 34: 0(0,4.92) 1(-100,4.92) 2(-200,4.92) 3(-300,4.92) 4(-400,4.92) 5(-500,4.92) 6(-600,4.92) 7(-700,4.92) 8(-860,4.92) 9(-960,4.92) 10(-1060,4.92) 11(-1160,4.92) 12(-1260,4.92) 13(-1360,4.92) 14(-1460,4.92) 15(-1560,4.92) 18(-700,-1895.08) 19(-800,-1895.08) 20(-900,-1895.08) 21(-1000,-1895.08) 22(-1100,-1895.08) 23(-1200,-1895.08) A0(-500,-1895.08) A1(-400,-1895.08) A2(-300,-1895.08) A3(-200,-1895.08) A4(-100,-1895.08) A5(0,-1895.08)
Top Overlay:
  lines w10: -1594.49,104.92 40,104.92 100,44.92 100,-405.08 200,-505.08 200,-1795.08 100,-1895.08 100,-1955.08 cw(c60.5,-1955.58) 61,-1995.08 -1240.16,-1995.08
  lines w12: -100,-170.08 -80,-170.08 -95,-155.08 -115,-175.08 -75,-175.08 ; -95,-165.08 -95,-160.08 ; -15,-150.08 25,-150.08 5,-170.08 -10,-155.08 10,-155.08 ; 5,-165.08 5,-160.08 ; -130,-180.08 -60,-180.08 -95,-145.08 -130,-180.08 ; -30,-145.08 40,-145.08 5,-180.08 -30,-145.08
  text "GND" at -1435,-195.08 h47.6
  text "0" at 17.58,-96.8 h47.6
  text "1" at -82.42,-80.94 h47.6
  text "2" at -182.42,-96.8 h47.6
  text "~3" at -275,-155.08 h86.61
  text "4" at -382.42,-96.8 h47.6
  text "~5" at -470,-155.08 h86.61
  text "~6" at -575,-155.08 h86.61
  text "7" at -682.42,-96.8 h47.6
  text "8" at -842.42,-96.8 h47.6
  text "~9" at -935,-145.08 h86.61
  text "~10" at -1035,-200.08 h86.61
  text "~11" at -1135,-200.08 h86.61
  text "12" at -1242.42,-136.46 h47.6
  text "13" at -1342.42,-136.46 h47.6
  text "A0" at -531,-1824.08 h34
  text "A5" at -21,-1824.08 h34
  text "5V" at -980,-1820.08 h47.6
  text "A1" at -421,-1824.08 h34
  text "A3" at -221,-1824.08 h34
  text "A4" at -121,-1824.08 h34
  text "3V3" at -1075,-1825.08 h86.61
  text "TX" at -65,-284.08 h47.6
  text "GND" at -919,-1825.08 h47.6
  text "A2" at -321,-1824.08 h34
  text "RX" at 35,-285.08 h47.6
  text "VIN" at -675,-1825.08 h47.6
  text "RST" at -1185,-1820.08 h47.6

## NODEMCU [mil]
pads (34):
  rect 56x112 hole 36: 1(0,0)
  oval 56x112 hole 36: 2(-100,0) 3(-200,0) 4(-300,0) 5(-400,0) 6(-500,0) 7(-600,0) 8(-700,0) 9(-800,0) 10(-900,0) 11(-1000,0) 12(-1100,0) 13(-1200,0) 14(-1300,0) 15(-1400,0) 16(-1401,-876) 17(-1301,-876) 18(-1201,-876) 19(-1101,-876) 20(-1001,-876) 21(-901,-876) 22(-801,-876) 23(-701,-876) 24(-601,-876) 25(-501,-876) 26(-401,-876) 27(-301,-876) 28(-201,-876) 29(-101,-876) 30(-1,-876)
  round 118.11 hole 118.11: H(-1578,-853) H(-1578,-23) H(176,-853) H(176,-23)
Top Overlay:
  lines w7: -1651,-853 -1651,-23 ; -1578,-926 -1520,-926 176,-926 ; -1578,50 176,50 ; 249,-853 249,-23
  lines w7.01: -1651,-853 ccw(c-1578,-853) -1578,-926 ; -1651,-23 cw(c-1578,-23) -1578,50 ; 176,-926 ccw(c176,-853) 249,-853 ; 176,50 cw(c176,-23) 249,-23
Mechanical 8:
  lines w5: -1451,-926 49,-926 49,-826 -1451,-826 -1451,-926 ; -1450,-50 -1450,50 50,50 50,-50 -1450,-50
3D body "ESP8266 v7.stp": height -88.97, standoff -647.64, extent -1654.59,-932.31 267.46,73.59
3D body "Header Female 2p.step": height 334.65, standoff -82.42, extent -950,-50 -750,50
3D body "Header Female 2p.step": height 334.65, standoff -82.42, extent -1150,-50 -950,50
3D body "Header Female 2p.step": height 334.65, standoff -82.42, extent -150,-50 50,50
3D body "Header Female 2p.step": height 334.65, standoff -82.42, extent -350,-50 -150,50
3D body "Header Female 2p.step": height 334.65, standoff -82.42, extent -550,-50 -350,50
3D body "Header Female 2p.step": height 334.65, standoff -82.42, extent -750,-50 -550,50
3D body "Header Female 2p.step": height 334.65, standoff -82.42, extent -1350,-50 -1150,50
3D body "Header Female 1p.step": height 334.65, standoff -82.42, extent -1450,-50 -1350,50
3D body "Header Female 1p.step": height 334.65, standoff -82.42, extent -1451,-926 -1351,-826
3D body "Header Female 2p.step": height 334.65, standoff -82.42, extent -1351,-926 -1151,-826
3D body "Header Female 2p.step": height 334.65, standoff -82.42, extent -751,-926 -551,-826
3D body "Header Female 2p.step": height 334.65, standoff -82.42, extent -551,-926 -351,-826
3D body "Header Female 2p.step": height 334.65, standoff -82.42, extent -351,-926 -151,-826
3D body "Header Female 2p.step": height 334.65, standoff -82.42, extent -151,-926 49,-826
3D body "Header Female 2p.step": height 334.65, standoff -82.42, extent -1151,-926 -951,-826
3D body "Header Female 2p.step": height 334.65, standoff -82.42, extent -951,-926 -751,-826

## NODEMCU 1 [mil]
pads (30):
  rect 56x112 hole 36: 1(0,0)
  oval 56x112 hole 36: 2(-100,0) 3(-200,0) 4(-300,0) 5(-400,0) 6(-500,0) 7(-600,0) 8(-700,0) 9(-800,0) 10(-900,0) 11(-1000,0) 12(-1100,0) 13(-1200,0) 14(-1300,0) 15(-1400,0) 16(-1401,-876) 17(-1301,-876) 18(-1201,-876) 19(-1101,-876) 20(-1001,-876) 21(-901,-876) 22(-801,-876) 23(-701,-876) 24(-601,-876) 25(-501,-876) 26(-401,-876) 27(-301,-876) 28(-201,-876) 29(-101,-876) 30(-1,-876)
Top Overlay:
  lines w7: -1651,-853 -1651,-23 ; -1578,-926 -1520,-926 176,-926 ; -1578,50 176,50 ; 249,-853 249,-23
  lines w7.01: -1651,-853 ccw(c-1578,-853) -1578,-926 ; -1651,-23 cw(c-1578,-23) -1578,50 ; 176,-926 ccw(c176,-853) 249,-853 ; 176,50 cw(c176,-23) 249,-23
Mechanical 8:
  lines w5: -1451,-926 -1451,-826 49,-826 49,-926 -1451,-926 ; -1450,-50 50,-50 50,50 -1450,50 -1450,-50
3D body "Header Female 2p.step": height 334.65, standoff -82.42, extent -951,-926 -751,-826
3D body "Header Female 2p.step": height 334.65, standoff -82.42, extent -1151,-926 -951,-826
3D body "Header Female 2p.step": height 334.65, standoff -82.42, extent -151,-926 49,-826
3D body "Header Female 2p.step": height 334.65, standoff -82.42, extent -351,-926 -151,-826
3D body "Header Female 2p.step": height 334.65, standoff -82.42, extent -551,-926 -351,-826
3D body "Header Female 2p.step": height 334.65, standoff -82.42, extent -751,-926 -551,-826
3D body "Header Female 2p.step": height 334.65, standoff -82.42, extent -1351,-926 -1151,-826
3D body "Header Female 1p.step": height 334.65, standoff -82.42, extent -1451,-926 -1351,-826
3D body "Header Female 1p.step": height 334.65, standoff -82.42, extent -1450,-50 -1350,50
3D body "Header Female 2p.step": height 334.65, standoff -82.42, extent -1350,-50 -1150,50
3D body "Header Female 2p.step": height 334.65, standoff -82.42, extent -750,-50 -550,50
3D body "Header Female 2p.step": height 334.65, standoff -82.42, extent -550,-50 -350,50
3D body "Header Female 2p.step": height 334.65, standoff -82.42, extent -350,-50 -150,50
3D body "Header Female 2p.step": height 334.65, standoff -82.42, extent -150,-50 50,50
3D body "Header Female 2p.step": height 334.65, standoff -82.42, extent -1150,-50 -950,50
3D body "Header Female 2p.step": height 334.65, standoff -82.42, extent -950,-50 -750,50
3D body "ESP8266 v7.stp": height -88.97, standoff -647.64, extent -1654.59,-932.31 267.46,73.59

## STM32 BLUE PILL [mil]
pads (40):
  rect 56x112 hole 36: 1(0,0)
  oval 56x112 hole 36: 2(-100,0) 3(-200,0) 4(-300,0) 5(-400,0) 6(-500,0) 7(-600,0) 8(-700,0) 9(-800,0) 10(-900,0) 11(-1000,0) 12(-1100,0) 13(-1200,0) 14(-1300,0) 15(-1400,0) 16(-1500,0) 17(-1600,0) 18(-1700,0) 19(-1800,0) 20(-1900,0)
  oval 53.15x106.29 hole 35.43: 21(-1900,-600) 22(-1800,-600) 23(-1700,-600) 24(-1600,-600) 25(-1500,-600) 26(-1400,-600) 27(-1300,-600) 28(-1200,-600) 29(-1100,-600) 30(-1000,-600) 31(-900,-600) 32(-800,-600) 33(-700,-600) 34(-600,-600) 35(-500,-600) 36(-400,-600) 37(-300,-600) 38(-200,-600) 39(-100,-600) 40(0,-600)
Top Overlay:
  lines w5: -1950,-425 -1950,-475 -1900,-475 -1900,-425 ; -1950,-425 -2000,-425 -2000,-175 -1950,-175 ; -1950,-425 -1900,-425 ; -1950,-175 -1950,-125 -1900,-125 -1900,-175 ; -1950,-175 -1900,-175 ; -1900,-425 -1800,-425 ; -1900,-175 -1800,-175 ; -1800,-425 -1800,-475 -1750,-475 -1750,-425 ; -1800,-425 -1750,-425 ; -1800,-175 -1800,-125 -1750,-125 -1750,-175 ; -1800,-175 -1750,-175 ; -1750,-425 -1732.28,-425 -1732.28,-175 -1750,-175 ; -20.67,-400 29.33,-400 ; -20.67,-400 -20.67,-300 ; -20.67,-400 -20.67,-500 29.33,-500 29.33,-400 ; -20.67,-300 29.33,-300 ; -20.67,-300 -20.67,-200 ; -20.67,-200 29.33,-200 ; -20.67,-200 -20.67,-100 29.33,-100 29.33,-200 ; 29.33,-400 29.33,-300 ; 29.33,-300 29.33,-200 ; -2000,-750 -2000,150 100,150 100,-750 -2000,-750
  lines w32: -45.67,-450 279.33,-450 ; -45.67,-350 279.33,-350 ; -45.67,-250 279.33,-250 ; -45.67,-150 279.33,-150
Mechanical 8:
  lines w5: -1951.77,-650 50,-650 50,-550 -1951.77,-550 -1951.77,-650 ; -1951.77,-50 -1951.77,50 50,50 50,-50 -1951.77,-50
3D body "User Library-BluePill.STEP": height 775.98, standoff 89.72, extent -2012.79,-742.91 295.72,142.92
3D body "Header Female 2p.step": height 334.65, standoff -82.42, extent -950,-50 -750,50
3D body "Header Female 2p.step": height 334.65, standoff -82.42, extent -1150,-50 -950,50
3D body "Header Female 2p.step": height 334.65, standoff -82.42, extent -150,-50 50,50
3D body "Header Female 2p.step": height 334.65, standoff -82.42, extent -350,-50 -150,50
3D body "Header Female 2p.step": height 334.65, standoff -82.42, extent -550,-50 -350,50
3D body "Header Female 2p.step": height 334.65, standoff -82.42, extent -750,-50 -550,50
3D body "Header Female 2p.step": height 334.65, standoff -82.42, extent -1350,-50 -1150,50
3D body "Header Female 1p.step": height 334.65, standoff -82.42, extent -1450,-50 -1350,50
3D body "Header Female 1p.step": height 334.65, standoff -82.42, extent -1950,-50 -1850,50
3D body "Header Female 2p.step": height 334.65, standoff -82.42, extent -1850,-50 -1650,50
3D body "Header Female 2p.step": height 334.65, standoff -82.42, extent -1650,-50 -1450,50
3D body "Header Female 2p.step": height 334.65, standoff -82.42, extent -1650,-650 -1450,-550
3D body "Header Female 2p.step": height 334.65, standoff -82.42, extent -1850,-650 -1650,-550
3D body "Header Female 1p.step": height 334.65, standoff -82.42, extent -1950,-650 -1850,-550
3D body "Header Female 1p.step": height 334.65, standoff -82.42, extent -1450,-650 -1350,-550
3D body "Header Female 2p.step": height 334.65, standoff -82.42, extent -1350,-650 -1150,-550
3D body "Header Female 2p.step": height 334.65, standoff -82.42, extent -750,-650 -550,-550
3D body "Header Female 2p.step": height 334.65, standoff -82.42, extent -550,-650 -350,-550
3D body "Header Female 2p.step": height 334.65, standoff -82.42, extent -350,-650 -150,-550
3D body "Header Female 2p.step": height 334.65, standoff -82.42, extent -150,-650 50,-550
3D body "Header Female 2p.step": height 334.65, standoff -82.42, extent -1150,-650 -950,-550
3D body "Header Female 2p.step": height 334.65, standoff -82.42, extent -950,-650 -750,-550